# Altium schematic symbol library lib_datalogger.SchLib: 1246 symbols (part 6 of 16) (continued)
## CMP-009-00005-6
designator R?, comment Resistor 0R +/- 5% 0402 100 mW  value 0  Mounting Technology: SM  Voltage Rating: 50V  RoHS Compliant: True  Case/Package: 0402  Pins: 2  Tolerance: 5%  Min Operating Temperature: -55°C  Max Operating Temperature: 155°C  Power: 100mW
Chip Resistor, 0 Ohm, 0.1 W, -55 to 155 degC, 0402 (1005 Metric)
footprint RESC1005X40X25NL05T05 (Chip Resistor, 2-Leads, Body 1.05x0.55mm, IPC Medium Density)
footprint RESC1005X40X25ML05T05 (Chip Resistor, 2-Leads, Body 1.05x0.55mm, IPC Low Density)
footprint RESC1005X40X25LL05T05 (Chip Resistor, 2-Leads, Body 1.05x0.55mm, IPC High Density)
pins: 1, 2

## CMP-009-00006-6
designator R?, comment Resistor 0R +/- 5% 0603 100 mW  value 0  RoHS Compliant: True  Voltage Rating: 50V  Max Operating Temperature: 155°C  Pins: 2  Min Operating Temperature: -55°C  Tolerance: 5%  Power: 100mW  Mounting Technology: SM  Case/Package: 0603
Chip Resistor, 0 Ohm, 0.1 W, -55 to 155 degC, 0603 (1608 Metric)
footprint RESC1608X55X25ML10T15 (Chip Resistor, 2-Leads, Body 1.70x0.90mm, IPC Low Density)
footprint RESC1608X55X25NL10T15 (Chip Resistor, 2-Leads, Body 1.70x0.90mm, IPC Medium Density)
footprint RESC1608X55X25LL10T15 (Chip Resistor, 2-Leads, Body 1.70x0.90mm, IPC High Density)
pins: 1, 2

## CMP-009-00007-6
designator R?, comment Resistor 0R +/- 5% 0805 125 mW  value 0  Max Operating Temperature: 155°C  Case/Package: 0805  Tolerance: 5%  Voltage Rating: 50V  Pins: 2  Min Operating Temperature: -55°C  Mounting Technology: SM  Power: 125mW  RoHS Compliant: True
Chip Resistor, 0 Ohm, 0.125 W, -55 to 155 degC, 0805 (2012 Metric)
footprint RESC2013X60X35LL10T20 (Chip Resistor, 2-Leads, Body 2.1x1.35mm, IPC High Density)
footprint RESC2013X60X35ML10T20 (Chip Resistor, 2-Leads, Body 2.00x1.25mm, IPC Low Density)
footprint RESC2013X60X35NL10T20 (Chip Resistor, 2-Leads, Body 2.1x1.35mm, IPC Medium Density)
pins: 1, 2

## CMP-009-00008-6
designator R?, comment Resistor 0R +/- 0.05% 1206 250 mW  value 0  Min Operating Temperature: -55°C  Tolerance: 0.05%  RoHS Compliant: True  Power: 250mW  Max Operating Temperature: 155°C  Voltage Rating: 200V  Mounting Technology: SM  Case/Package: 1206  Pins: 2
Chip Resistor, 0 Ohm, 0.25 W, -55 to 155 degC, 1206 (3216 Metric)
footprint RESC3116X70X50LL13T20 (Chip Resistor, 2-Leads, Body 3.25x1.65mm, IPC High Density)
footprint RESC3116X70X50ML13T20 (Chip Resistor, 2-Leads, Body 3.25x1.65mm, IPC Low Density)
footprint RESC3116X70X50NL13T20 (Chip Resistor, 2-Leads, Body 3.25x1.65mm, IPC Medium Density)
pins: 1, 2

## CMP-009-00009-6
designator R?, comment Resistor 1k +/-1% 0402 100 mW  value 1k  Tolerance: 1%  Voltage Rating: 50V  Power: 100mW  RoHS Compliant: True  Mounting Technology: SM  Pins: 2  Case/Package: 0402  Min Operating Temperature: -55°C  Max Operating Temperature: 155°C
Chip Resistor, 1 KOhm, +/- 1%, 0.1 W, -55 to 155 degC, 0402 (1005 Metric)
footprint RESC1005X40X25NL05T05 (Chip Resistor, 2-Leads, Body 1.05x0.55mm, IPC Medium Density)
footprint RESC1005X40X25ML05T05 (Chip Resistor, 2-Leads, Body 1.05x0.55mm, IPC Low Density)
footprint RESC1005X40X25LL05T05 (Chip Resistor, 2-Leads, Body 1.05x0.55mm, IPC High Density)
pins: 1, 2

## CMP-009-00010-6
designator R?, comment Resistor 1k +/-1% 0805 125 mW  value 1k  Voltage Rating: 150V  Tolerance: 1%  Max Operating Temperature: 155°C  Case/Package: 0805  Min Operating Temperature: -55°C  Power: 125mW  Mounting Technology: SM  Pins: 2  RoHS Compliant: True
Chip Resistor, 1 KOhm, +/- 1%, 0.125 W, -55 to 155 degC, 0805 (2013 Metric)
footprint RESC2013X70X40LL20T20 (Chip Resistor, 2-Leads, Body 2.2x1.35mm, IPC High Density)
footprint RESC2013X70X40ML20T20 (Chip Resistor, 2-Leads, Body 2.2x1.35mm, IPC Low Density)
footprint RESC2013X70X40NL20T20 (Chip Resistor, 2-Leads, Body 2.2x1.35mm, IPC Medium Density)
pins: 1, 2

## CMP-009-00011-6
designator R?, comment Resistor 1k +/-1% 1206 250 mW  value 1k  Case/Package: 1206  Power: 250mW  Mounting Technology: SM  RoHS Compliant: True  Min Operating Temperature: -55°C  Tolerance: 1%  Pins: 2  Max Operating Temperature: 155°C  Voltage Rating: 200V
Chip Resistor, 1 KOhm, +/- 1%, 0.25 W, -55 to 155 degC, 1206 (3216 Metric)
footprint RESC3116X70X50LL13T20 (Chip Resistor, 2-Leads, Body 3.25x1.65mm, IPC High Density)
footprint RESC3116X70X50ML13T20 (Chip Resistor, 2-Leads, Body 3.25x1.65mm, IPC Low Density)
footprint RESC3116X70X50NL13T20 (Chip Resistor, 2-Leads, Body 3.25x1.65mm, IPC Medium Density)
pins: 1, 2

## CMP-009-00012-5
designator R?, comment Resistor 1k +/-1% 0402 63 mW  value 100k  Power: 63mW  Max Operating Temperature: 155°C  Min Operating Temperature: -55°C  Case/Package: 0402  Pins: 2  RoHS Compliant: True  Tolerance: 1%  Mounting Technology: SM
Chip Resistor, 1 KOhm, +/- 1%, 63 mW, -55 to 155 degC, 0402 (1005 Metric)
footprint RESC0805(2012)_L (Chip Resistor, Body 2.0x1.3mm, IPC High Density)
footprint RESC1005X40X25NL05T05 (Chip Resistor, 2-Leads, Body 1.05x0.55mm, IPC Medium Density)
footprint RESC1005X40X25ML05T05 (Chip Resistor, 2-Leads, Body 1.05x0.55mm, IPC Low Density)
footprint RESC1005X40X25LL05T05 (Chip Resistor, 2-Leads, Body 1.05x0.55mm, IPC High Density)
pins: 1, 2
1 alternate drawing of the same symbol

## CMP-009-00013-5
designator R?, comment Resistor 1k +/-5% 0402 63 mW  value 1k  Tolerance: 5%  Case/Package: 0402  Mounting Technology: SM  Min Operating Temperature: -55°C  Pins: 2  Max Operating Temperature: 155°C  RoHS Compliant: True  Power: 63mW
Chip Resistor, 1 KOhm, +/- 5%, 0.063 W, -55 to 155 degC, 0402 (1005 Metric)
footprint RESC0805(2012)_L (Chip Resistor, Body 2.0x1.3mm, IPC High Density)
footprint RESC1005X40X25NL10T10 (Chip Resistor, 2-Leads, Body 1.1x0.6mm, IPC Medium Density)
footprint RESC1005X40X25LL10T10 (Chip Resistor, 2-Leads, Body 1.1x0.6mm, IPC High Density)
footprint RESC1005X40X25ML10T10 (Chip Resistor, 2-Leads, Body 1.1x0.6mm, IPC Low Density)
pins: 1, 2
1 alternate drawing of the same symbol

## CMP-009-00014-5
designator R?, comment Resistor 1k +/-1% 0603 100 mW  value 1k  Mounting Technology: SM  Voltage Rating: 50V  Pins: 2  Case/Package: 0603  Power: 100mW  Min Operating Temperature: -55°C  Tolerance: 1%  RoHS Compliant: True  Max Operating Temperature: 155°C
Chip Resistor, 1 KOhm, +/-1%, 0.1 W, -55 to 155 degC, 0603 (1608 Metric)
footprint RESC0805(2012)_L (Chip Resistor, Body 2.0x1.3mm, IPC High Density)
footprint RESC1608X55X25ML10T15 (Chip Resistor, 2-Leads, Body 1.70x0.90mm, IPC Low Density)
footprint RESC1608X55X25NL10T15 (Chip Resistor, 2-Leads, Body 1.70x0.90mm, IPC Medium Density)
footprint RESC1608X55X25LL10T15 (Chip Resistor, 2-Leads, Body 1.70x0.90mm, IPC High Density)
pins: 1, 2
1 alternate drawing of the same symbol

## CMP-009-00015-5
designator R?, comment Resistor 10k +/-1% 0402 100 mW  value 10k  Case/Package: 0402  RoHS Compliant: True  Min Operating Temperature: -55°C  Mounting Technology: SM  Tolerance: 1%  Voltage Rating: 50V  Max Operating Temperature: 155°C  Pins: 2  Power: 100mW
Chip Resistor, 10 KOhm, +/- 1%, 0.1 W, -55 to 155 degC, 0402 (1005 Metric)
footprint RESC0805(2012)_L (Chip Resistor, Body 2.0x1.3mm, IPC High Density)
footprint RESC1005X40X25NL05T05 (Chip Resistor, 2-Leads, Body 1.05x0.55mm, IPC Medium Density)
footprint RESC1005X40X25ML05T05 (Chip Resistor, 2-Leads, Body 1.05x0.55mm, IPC Low Density)
footprint RESC1005X40X25LL05T05 (Chip Resistor, 2-Leads, Body 1.05x0.55mm, IPC High Density)
pins: 1, 2
1 alternate drawing of the same symbol

## CMP-009-00016-5
designator R?, comment Resistor 10k +/-1% 1206 250 mW  value 10k  Pins: 2  Max Operating Temperature: 155°C  Tolerance: 1%  Power: 250mW  Voltage Rating: 200V  RoHS Compliant: True  Case/Package: 1206  Min Operating Temperature: -55°C  Mounting Technology: SM
Chip Resistor, 10 KOhm, +/- 1%, 0.25 W, -55 to 155 degC, 1206 (3216 Metric)
footprint RESC0805(2012)_L (Chip Resistor, Body 2.0x1.3mm, IPC High Density)
footprint RESC3216X60X45NL15T20 (Chip Resistor, 2-Leads, Body 3.3x1.75mm, IPC Medium Density)
footprint RESC3216X60X45ML15T20 (Chip Resistor, 2-Leads, Body 3.3x1.75mm, IPC Low Density)
footprint RESC3216X60X45LL15T20 (Chip Resistor, 2-Leads, Body 3.3x1.75mm, IPC High Density)
pins: 1, 2
1 alternate drawing of the same symbol

## CMP-009-00017-5
designator R?, comment Resistor 10k +/-1% 0603 100 mW  value 10k  RoHS Compliant: True  Voltage Rating: 50V  Min Operating Temperature: -55°C  Pins: 2  Case/Package: 0603  Power: 100mW  Mounting Technology: SM  Max Operating Temperature: 155°C  Tolerance: 1%
Chip Resistor, 10 KOhm, +/- 1%, 01 W, -55 to 155 degC, 0603 (1608 Metric)
footprint RESC0805(2012)_L (Chip Resistor, Body 2.0x1.3mm, IPC High Density)
footprint RESC1608X55X25ML10T15 (Chip Resistor, 2-Leads, Body 1.70x0.90mm, IPC Low Density)
footprint RESC1608X55X25NL10T15 (Chip Resistor, 2-Leads, Body 1.70x0.90mm, IPC Medium Density)
footprint RESC1608X55X25LL10T15 (Chip Resistor, 2-Leads, Body 1.70x0.90mm, IPC High Density)
pins: 1, 2
1 alternate drawing of the same symbol

## CMP-009-00018-5
designator R?, comment Resistor 10k +/-1% 0805 125 mW  value 10k  Tolerance: 1%  Pins: 2  Min Operating Temperature: -55°C  Case/Package: 0805  Max Operating Temperature: 155°C  RoHS Compliant: True  Power: 125mW  Voltage Rating: 150V  Mounting Technology: SM
Chip Resistor, 10 KOhm, +/- 1%, 125 mW, -55 to 155 degC, 0805 (2012 Metric)
footprint RESC0805(2012)_L (Chip Resistor, Body 2.0x1.3mm, IPC High Density)
footprint RESC2013X50X35ML15T15 (Chip Resistor, 2-Leads, Body 2.2x1.4mm, IPC Low Density)
footprint RESC2013X50X35LL15T15 (Chip Resistor, 2-Leads, Body 2.2x1.4mm, IPC High Density)
footprint RESC2013X50X35NL15T15 (Chip Resistor, 2-Leads, Body 2.2x1.4mm, IPC Medium Density)
pins: 1, 2
1 alternate drawing of the same symbol

## CMP-009-00019-5
designator R?, comment Resistor 10k +/-1% 0402 63 mW  value 10k  Case/Package: 0402  Power: 63mW  Mounting Technology: SM  Pins: 2  Min Operating Temperature: -55°C  Tolerance: 1%  RoHS Compliant: True  Max Operating Temperature: 155°C  Voltage Rating: 50V
Chip Resistor, 10 KOhm, +/- 1%, 63 mW, -55 to 155 degC, 0402 (1005 Metric)
footprint RESC0805(2012)_L (Chip Resistor, Body 2.0x1.3mm, IPC High Density)
footprint RESC1005X40X25NL05T05 (Chip Resistor, 2-Leads, Body 1.05x0.55mm, IPC Medium Density)
footprint RESC1005X40X25ML05T05 (Chip Resistor, 2-Leads, Body 1.05x0.55mm, IPC Low Density)
footprint RESC1005X40X25LL05T05 (Chip Resistor, 2-Leads, Body 1.05x0.55mm, IPC High Density)
pins: 1, 2
1 alternate drawing of the same symbol

## CMP-009-00020-5
designator R?, comment Resistor 10R +/-5% 0402 63 mW  value 10  Case/Package: 0402  Max Operating Temperature: 155°C  Min Operating Temperature: -55°C  Pins: 2  Power: 63mW  Tolerance: 5%  RoHS Compliant: True  Mounting Technology: SM
Chip Resistor, 10 Ohm, +/- 5%, 0.063 W, -55 to 155 degC, 0402 (1005 Metric)
footprint RESC0805(2012)_L (Chip Resistor, Body 2.0x1.3mm, IPC High Density)
footprint RESC1005X40X25NL10T10 (Chip Resistor, 2-Leads, Body 1.1x0.6mm, IPC Medium Density)
footprint RESC1005X40X25LL10T10 (Chip Resistor, 2-Leads, Body 1.1x0.6mm, IPC High Density)
footprint RESC1005X40X25ML10T10 (Chip Resistor, 2-Leads, Body 1.1x0.6mm, IPC Low Density)
pins: 1, 2
1 alternate drawing of the same symbol

## CMP-009-00021-5
designator R?, comment Resistor 100k +/-1% 0402 63 mW  value 100k  Pins: 2  Tolerance: 1%  Max Operating Temperature: 155°C  Case/Package: 0402  Min Operating Temperature: -55°C  Voltage Rating: 50V  Power: 63mW  Mounting Technology: SM  RoHS Compliant: True
Chip Resistor, 100 KOhm, +/- 1%, 0.063 W, -55 to 155 degC, 0402 (1005 Metric)
footprint RESC0805(2012)_L (Chip Resistor, Body 2.0x1.3mm, IPC High Density)
footprint RESC1005X40X25NL05T05 (Chip Resistor, 2-Leads, Body 1.05x0.55mm, IPC Medium Density)
footprint RESC1005X40X25ML05T05 (Chip Resistor, 2-Leads, Body 1.05x0.55mm, IPC Low Density)
footprint RESC1005X40X25LL05T05 (Chip Resistor, 2-Leads, Body 1.05x0.55mm, IPC High Density)
pins: 1, 2
1 alternate drawing of the same symbol

## CMP-009-00022-5
designator R?, comment Resistor 100k +/-1% 0402 100 mW  value 100k  Mounting Technology: SM  Pins: 2  Power: 100mW  Min Operating Temperature: -55°C  Tolerance: 1%  RoHS Compliant: True  Case/Package: 0402  Voltage Rating: 50V  Max Operating Temperature: 155°C
Chip Resistor, 100 KOhm, +/- 1%, 0.1 W, -55 to 155 degC, 0402 (1005 Metric)
footprint RESC0805(2012)_L (Chip Resistor, Body 2.0x1.3mm, IPC High Density)
footprint RESC1005X40X25NL05T05 (Chip Resistor, 2-Leads, Body 1.05x0.55mm, IPC Medium Density)
footprint RESC1005X40X25ML05T05 (Chip Resistor, 2-Leads, Body 1.05x0.55mm, IPC Low Density)
footprint RESC1005X40X25LL05T05 (Chip Resistor, 2-Leads, Body 1.05x0.55mm, IPC High Density)
pins: 1, 2
1 alternate drawing of the same symbol

## CMP-009-00023-5
designator R?, comment Resistor 100k +/-1% 0603 100 mW  value 100k  Max Operating Temperature: 155°C  RoHS Compliant: True  Voltage Rating: 50V  Tolerance: 1%  Pins: 2  Case/Package: 0603  Mounting Technology: SM  Min Operating Temperature: -55°C  Power: 100mW
Chip Resistor, 100 KOhm, +/- 1%, 0.1 W, -55 to 155 degC, 0603 (1608 Metric)
footprint RESC0805(2012)_L (Chip Resistor, Body 2.0x1.3mm, IPC High Density)
footprint RESC1608X55X25ML10T15 (Chip Resistor, 2-Leads, Body 1.70x0.90mm, IPC Low Density)
footprint RESC1608X55X25NL10T15 (Chip Resistor, 2-Leads, Body 1.70x0.90mm, IPC Medium Density)
footprint RESC1608X55X25LL10T15 (Chip Resistor, 2-Leads, Body 1.70x0.90mm, IPC High Density)
pins: 1, 2
1 alternate drawing of the same symbol

## CMP-009-00024-5
designator R?, comment Resistor 100k +/-1% 0805 125 mW  value 100k  Power: 125mW  Max Operating Temperature: 155°C  Mounting Technology: SM  Voltage Rating: 150V  RoHS Compliant: True  Tolerance: 1%  Case/Package: 0805  Min Operating Temperature: -55°C  Pins: 2
Chip Resistor, 100 KOhm, +/- 1%, 0.125 W, -55 to 155 degC, 0805 (2012 Metric)
footprint RESC0805(2012)_L (Chip Resistor, Body 2.0x1.3mm, IPC High Density)
footprint RESC2013X70X40LL20T20 (Chip Resistor, 2-Leads, Body 2.2x1.35mm, IPC High Density)
footprint RESC2013X70X40ML20T20 (Chip Resistor, 2-Leads, Body 2.2x1.35mm, IPC Low Density)
footprint RESC2013X70X40NL20T20 (Chip Resistor, 2-Leads, Body 2.2x1.35mm, IPC Medium Density)
pins: 1, 2
1 alternate drawing of the same symbol

## CMP-009-00025-5
designator R?, comment Resistor 100k +/-1% 1206 250 mW  value 100k  RoHS Compliant: True  Max Operating Temperature: 155°C  Voltage Rating: 200V  Pins: 2  Tolerance: 1%  Mounting Technology: SM  Case/Package: 1206  Min Operating Temperature: -55°C  Power: 250mW
Chip Resistor, 100 KOhm, +/- 1%, 0.25 W, -55 to 155 degC, 1206 (3216 Metric)
footprint RESC0805(2012)_L (Chip Resistor, Body 2.0x1.3mm, IPC High Density)
footprint RESC3216X60X45NL15T20 (Chip Resistor, 2-Leads, Body 3.3x1.75mm, IPC Medium Density)
footprint RESC3216X60X45ML15T20 (Chip Resistor, 2-Leads, Body 3.3x1.75mm, IPC Low Density)
footprint RESC3216X60X45LL15T20 (Chip Resistor, 2-Leads, Body 3.3x1.75mm, IPC High Density)
pins: 1, 2
1 alternate drawing of the same symbol

## CMP-009-00026-5
designator R?, comment Resistor 15k +/-1% 0402 63 mW  value 15k  Power: 63mW  Min Operating Temperature: -55°C  Tolerance: 1%  Max Operating Temperature: 155°C  Mounting Technology: SM  Case/Package: 0402  RoHS Compliant: True  Pins: 2
Chip Resistor, 15 KOhm, +/- 1%, 0.063 W, -55 to 155 degC, 0402 (1005 Metric)
footprint RESC0805(2012)_L (Chip Resistor, Body 2.0x1.3mm, IPC High Density)
footprint RESC1005X40X25NL10T10 (Chip Resistor, 2-Leads, Body 1.1x0.6mm, IPC Medium Density)
footprint RESC1005X40X25LL10T10 (Chip Resistor, 2-Leads, Body 1.1x0.6mm, IPC High Density)
footprint RESC1005X40X25ML10T10 (Chip Resistor, 2-Leads, Body 1.1x0.6mm, IPC Low Density)
pins: 1, 2
1 alternate drawing of the same symbol

## CMP-009-00027-5
designator R?, comment Resistor 22R +/-1% 0603 100 mW  value 22  Max Operating Temperature: 155°C  Min Operating Temperature: -55°C  Power: 100mW  Tolerance: 1%  Voltage Rating: 75V  RoHS Compliant: True  Mounting Technology: SM  Case/Package: 0603  Pins: 2
Chip Resistor, 22 Ohm, +/- 1%, 100 mW, -55 to 155 degC, 0603 (1608 Metric)
footprint RESC0805(2012)_L (Chip Resistor, Body 2.0x1.3mm, IPC High Density)
footprint RESC1609X50X30ML08T20 (Chip Resistor, 2-Leads, Body 1.65x0.95mm, IPC Low Density)
footprint RESC1609X50X30LL08T20 (Chip Resistor, 2-Leads, Body 1.65x0.95mm, IPC High Density)
footprint RESC1609X50X30NL08T20 (Chip Resistor, 2-Leads, Body 1.65x0.95mm, IPC Medium Density)
pins: 1, 2
1 alternate drawing of the same symbol

## CMP-009-00028-5
designator R?, comment Resistor 33k +/-5% 0402 63 mW  value 33k  Tolerance: 5%  Case/Package: 0402  Power: 63mW  Mounting Technology: SM  Min Operating Temperature: -55°C  Max Operating Temperature: 155°C  Pins: 2  RoHS Compliant: True
Chip Resistor, 33 KOhm, +/- 5%, 0.063 W, -55 to 155 degC, 0402 (1005 Metric)
footprint RESC0805(2012)_L (Chip Resistor, Body 2.0x1.3mm, IPC High Density)
footprint RESC1005X40X25NL10T10 (Chip Resistor, 2-Leads, Body 1.1x0.6mm, IPC Medium Density)
footprint RESC1005X40X25LL10T10 (Chip Resistor, 2-Leads, Body 1.1x0.6mm, IPC High Density)
footprint RESC1005X40X25ML10T10 (Chip Resistor, 2-Leads, Body 1.1x0.6mm, IPC Low Density)
pins: 1, 2
1 alternate drawing of the same symbol

## CMP-009-00029-5
designator R?, comment Resistor 33R +/-1% 0402 63 mW  value 33  Pins: 2  Power: 63mW  Mounting Technology: SM  Min Operating Temperature: -55°C  Tolerance: 1%  Max Operating Temperature: 155°C  RoHS Compliant: True  Case/Package: 0402
Chip Resistor, 33 Ohm, +/- 1%, 0.063 W, -55 to 155 degC, 0402 (1005 Metric)
footprint RESC0805(2012)_L (Chip Resistor, Body 2.0x1.3mm, IPC High Density)
footprint RESC1005X40X25NL10T10 (Chip Resistor, 2-Leads, Body 1.1x0.6mm, IPC Medium Density)
footprint RESC1005X40X25LL10T10 (Chip Resistor, 2-Leads, Body 1.1x0.6mm, IPC High Density)
footprint RESC1005X40X25ML10T10 (Chip Resistor, 2-Leads, Body 1.1x0.6mm, IPC Low Density)
pins: 1, 2
1 alternate drawing of the same symbol

## CMP-009-00030-5
designator R?, comment Resistor 4k7 +/-1% 0402 100 mW  value 4.7k  Mounting Technology: SM  Power: 100mW  RoHS Compliant: True  Voltage Rating: 50V  Tolerance: 1%  Min Operating Temperature: -55°C  Max Operating Temperature: 155°C  Case/Package: 0402  Pins: 2
Chip Resistor, 4.7 KOhm, +/- 1%, 0.1 W, -55 to 155 degC, 0402 (1005 Metric)
footprint RESC0805(2012)_L (Chip Resistor, Body 2.0x1.3mm, IPC High Density)
footprint RESC1005X40X25NL05T05 (Chip Resistor, 2-Leads, Body 1.05x0.55mm, IPC Medium Density)
footprint RESC1005X40X25ML05T05 (Chip Resistor, 2-Leads, Body 1.05x0.55mm, IPC Low Density)
footprint RESC1005X40X25LL05T05 (Chip Resistor, 2-Leads, Body 1.05x0.55mm, IPC High Density)
pins: 1, 2
1 alternate drawing of the same symbol

## CMP-009-00031-5
designator R?, comment Resistor 4k7 +/-1% 0603 100 mW  value 4.7k  Tolerance: 1%  Mounting Technology: SM  Case/Package: 0603  RoHS Compliant: True  Power: 100mW  Pins: 2  Min Operating Temperature: -55°C  Max Operating Temperature: 155°C
Chip Resistor, 4.7 KOhm, +/- 1%, 0.1 W, -55 to 155 degC, 0603 (1608 Metric)
footprint RESC0805(2012)_L (Chip Resistor, Body 2.0x1.3mm, IPC High Density)
footprint RESC1608X55X25ML10T15 (Chip Resistor, 2-Leads, Body 1.70x0.90mm, IPC Low Density)
footprint RESC1608X55X25NL10T15 (Chip Resistor, 2-Leads, Body 1.70x0.90mm, IPC Medium Density)
footprint RESC1608X55X25LL10T15 (Chip Resistor, 2-Leads, Body 1.70x0.90mm, IPC High Density)
pins: 1, 2
1 alternate drawing of the same symbol

## CMP-009-00032-5
designator R?, comment Resistor 4k7 +/-1% 0805 125 mW  value 4.7k  Max Operating Temperature: 155°C  Power: 125mW  Min Operating Temperature: -55°C  Voltage Rating: 150V  Case/Package: 0805  RoHS Compliant: True  Pins: 2  Tolerance: 1%  Mounting Technology: SM
Chip Resistor, 4.7 KOhm, +/- 1%, 0.125 W, -55 to 155 degC, 0805 (2012 Metric)
footprint RESC0805(2012)_L (Chip Resistor, Body 2.0x1.3mm, IPC High Density)
footprint RESC2013X70X40LL20T20 (Chip Resistor, 2-Leads, Body 2.2x1.35mm, IPC High Density)
footprint RESC2013X70X40ML20T20 (Chip Resistor, 2-Leads, Body 2.2x1.35mm, IPC Low Density)
footprint RESC2013X70X40NL20T20 (Chip Resistor, 2-Leads, Body 2.2x1.35mm, IPC Medium Density)
pins: 1, 2
1 alternate drawing of the same symbol

## CMP-009-00033-5
designator R?, comment Resistor 4k7 +/-1% 1206 250 mW  value 4.7k  Pins: 2  Min Operating Temperature: -55°C  Max Operating Temperature: 155°C  Case/Package: 1206  Power: 250mW  Tolerance: 1%  RoHS Compliant: True  Mounting Technology: SM  Voltage Rating: 200V
Chip Resistor, 4.7 KOhm, +/- 1%, 0.25 W, -55 to 155 degC, 1206 (3216 Metric)
footprint RESC0805(2012)_L (Chip Resistor, Body 2.0x1.3mm, IPC High Density)
footprint RESC3116X70X50LL13T20 (Chip Resistor, 2-Leads, Body 3.25x1.65mm, IPC High Density)
footprint RESC3116X70X50ML13T20 (Chip Resistor, 2-Leads, Body 3.25x1.65mm, IPC Low Density)
footprint RESC3116X70X50NL13T20 (Chip Resistor, 2-Leads, Body 3.25x1.65mm, IPC Medium Density)
pins: 1, 2
1 alternate drawing of the same symbol

## CMP-009-00034-5
designator R?, comment Resistor 4k7 +/-1% 0402 63 mW  value 4.7k  Case/Package: 0402  Tolerance: 1%  Max Operating Temperature: 155°C  Pins: 2  RoHS Compliant: True  Min Operating Temperature: -55°C  Power: 63mW  Voltage Rating: 50V  Mounting Technology: SM
Chip Resistor, 4.7 KOhm, +/- 1%, 63 mW, -55 to 155 degC, 0402 (1005 Metric)
footprint RESC0805(2012)_L (Chip Resistor, Body 2.0x1.3mm, IPC High Density)
footprint RESC1005X40X25NL05T05 (Chip Resistor, 2-Leads, Body 1.05x0.55mm, IPC Medium Density)
footprint RESC1005X40X25ML05T05 (Chip Resistor, 2-Leads, Body 1.05x0.55mm, IPC Low Density)
footprint RESC1005X40X25LL05T05 (Chip Resistor, 2-Leads, Body 1.05x0.55mm, IPC High Density)
pins: 1, 2
1 alternate drawing of the same symbol

## CMP-009-00035-4
designator R?, comment 12FR050E  value 50m  Composition: Wirewound  Mounting Technology: TH  Tolerance: 1%  Diameter: 2.4mm  Package Description: 2-Pin Axial Lead, Dia 2.4 mm, Body Length 10.6 mm  Datasheet Version: Jun-15  Packaging: Bulk  Voltage Rating: 100mV  Max Operating Temperature: 275°C  RoHS Compliant: True  Package Quantity: 10  Case/Package: Axial  Power: 2W  Pins: 2  Manufacturer: Ohmite  Min Operating Temperature: -55°C
Axial Resistor, 50 mOhm, +/- 1%, 2 W, -55 to 275 degC, 2-Pin THD, RoHS, Bulk; Manufacturer URL: http://www.ohmite.com/; Datasheet URL: http://www.ohmite.com/cat/res_10.pdf; Package Reference: 12FR050E
footprint RESC0805(2012)_L (Chip Resistor, Body 2.0x1.3mm, IPC High Density)
footprint RESA86-1060X240 (Axial Resistor, 2-Leads, Dia 2.4mm, Body Length 10.6mm)
pins: 1, 2
1 alternate drawing of the same symbol

## CMP-009-00036-4
designator F?, comment 1812L110/33MR  value 200M  Packaging: TapeandReel  Datasheet Version: Feb-16  Package Quantity: 1000  Max Operating Temperature: 85°C  Voltage Rating: 33V  Mounting Technology: SM  Package Description: 2-Pin Surface Mount Device, Body 4.55 x 3.24 mm  Manufacturer: Littelfuse  RoHS Compliant: True  Case/Package: 1812  Max Current Rating: 20A  Min Operating Temperature: -40°C
Poly-Fuse (R) Resettable PTC, 0.8 W, 20 A, -40 to 85 degC, 2-Pin SMD, RoHS, Tape and Reel; Datasheet URL: http://www.littelfuse.com/~/media/electronics/datasheets/resettable_ptcs/littelfuse_ptc_1812l_datasheet.pdf.pdf; Package Reference: 1812L110/33MR; Manufacturer URL: http://www.littelfuse.com/; Current Rating: 20A
footprint LFUS-466_V (SMD, 2-Leads, Body 3.175x1.524mm)
footprint LFUS-1812L11033MR_V (SMD, 2-Leads, Body 4.55x3.24mm)
pins: 1, 2

## CMP-009-00037-2
designator R?, comment 3296W-1-102LF  Manufacturer: Bourns  Datasheet Version: May-16  Min Operating Temperature: -55°C  Max Operating Temperature: 150°C  Composition: Potentiometer  Package Description: 3-Pin Through Hole Device, Body 9.53 x 4.83 mm, Pitch 2.54 mm  Power: 500mW  Package Reference: 3296W-1-3  RoHS Compliant: True  Tolerance: 10%  Voltage Rating: 300V  Packaging: Rail/Tube  Mounting Technology: TH  Package Quantity: 50  Resistance: 1k
Square Trimpot(R) Trimming Potentiometer, 1000 Ohm, -55 to 125 degC, 3-Pin THD, RoHS, Tube; Manufacturer URL: http://www.bourns.com/; Case/Package: 3296W-1-3; Datasheet URL: http://www.bourns.com/docs/Product-Datasheets/3296.pdf
footprint BOUR-3296W-1-3 (THD, 3-Leads, Body 9.53x4.83mm, Pitch 2.54mm)
pins: 1 A, 2 B, 3 TAP

## CMP-009-00038-2
designator VR?, comment 3296W-1-103LF  Tolerance: 10%  Min Operating Temperature: -55°C  Case/Package: 3296W  Max Operating Temperature: 150°C  Voltage Rating: 300V  Mounting Technology: TH  Power: 500mW  Package Quantity: 50  Package Description: 3-Pin Through Hole Device, Body 9.53 x 4.83 mm, Pitch 2.54 mm  Packaging: Rail/Tube  Resistance: 10k  RoHS Compliant: True  Datasheet Version: May-16  Manufacturer: Bourns
Square Trimpot(R) Trimming Potentiometer, 10 KOhm, +/- 10%, 0.5 W, -55 to 125 degC, 3-Pin THD, RoHS, Tube; Package Reference: 3296W; Manufacturer URL: http://www.bourns.com/; Datasheet URL: http://www.bourns.com/docs/Product-Datasheets/3296.pdf
footprint BOUR-3296W (THD, 3-Leads, Body 9.53x4.83mm, Pitch 2.54mm)
pins: 1 CCW, 2 S, 3 CW

## CMP-009-00039-2
designator VR?, comment 3362P-1-103LF  Packaging: Rail/Tube  Package Reference: 3326P  Manufacturer: Bourns  Composition: Potentiometer  Tolerance: 10%  Package Description: 3-Pin Through Hole Device, Body 6.6 x 6.99 mm, Pitch 2.54 mm  Power: 500mW  Voltage Rating: 300V  Max Operating Temperature: 125°C  Min Operating Temperature: -55°C  Datasheet Version: May-16  Lead Pitch: 2.54mm  Pins: 3  Resistance: 10k  Package Quantity: 250  RoHS Compliant: True  Mounting Technology: TH
Square Trimpot(R) Trimming Potentiometer, 10 KOhm, 300 V, -55 to 125 degC, 3-Pin THD, RoHS, Tube; Manufacturer URL: http://www.bourns.com/; Datasheet URL: http://www.bourns.com/docs/Product-Datasheets/3362.pdf; Case/Package: 3326P
footprint BOUR-3362P (THD, 3-Leads, Body 6.6x6.99mm, Pitch 2.54mm)
pins: 1 CCW, 2 S, 3 CW

## CMP-009-00040-2
designator VR?, comment 3362P-1-104LF  RoHS Compliant: True  Voltage Rating: 300V  Manufacturer: Bourns  Resistance: 100k  Mounting Technology: TH  Power: 500mW  Min Operating Temperature: -55°C  Tolerance: 10%  Composition: Potentiometer  Package Quantity: 250  Lead Pitch: 2.54mm  Case/Package: 3326P  Package Description: 3-Pin Through Hole Device, Body 6.6 x 6.99 mm, Pitch 2.54 mm  Datasheet Version: May-16  Packaging: Rail/Tube  Max Operating Temperature: 125°C
Square Trimpot(R) Trimming Potentiometer, 100 KOhm, 300 V, -55 to 125 degC, 3-Pin THD, RoHS, Tube; Datasheet URL: http://www.bourns.com/docs/Product-Datasheets/3362.pdf; Package Reference: 3326P; Manufacturer URL: http://www.bourns.com/
footprint BOUR-3362P (THD, 3-Leads, Body 6.6x6.99mm, Pitch 2.54mm)
pins: 1 CCW, 2 S, 3 CW

## CMP-009-00041-2
designator R?, comment 35WR10KLFTR  Manufacturer: BI Technologies  Mounting Technology: SM  RoHS Compliant: True  Resistance: 10k  Package Quantity: 2000  Package Description: 3-Pin Surface Mount Device, Body 3 x 3.1 mm  Max Operating Temperature: 125°C  Composition: Potentiometer  Power: 100mW  Packaging: TapeandReel  Datasheet Version: Feb-10  Min Operating Temperature: -40°C  Voltage Rating: 50V  Tolerance: 25%
3 mm Single-Turn Open Frame Surface Mount Cermet Trimming Potentiometer, +/- 25%, 35 W, -40 to 125 degC, 3-Pin SMD, RoHS, Tape and Reel; Manufacturer URL: http://www.bi-technologies.net/; Datasheet URL: http://www.bitechnologies.com/pdfs/35.pdf; Package Reference: 35WR10KLFTR; Case/Package: 35WR10KLFTR
footprint BI-35WR10KLFTR-3_V (SMD, 3-Leads, Body 3x3.1mm)
pins: 1, 2, 3

## CMP-009-00042-4
designator RN?, comment CAY16-102J4LF  value 1k  Package Quantity: 5000  Mounting Technology: SM  Elements: 4  Voltage Rating: 50V  Max Operating Temperature: 125°C  Datasheet Version: Sep-14  Package Reference: CAY16-J4  Manufacturer: Bourns  RoHS Compliant: True  Packaging: TapeandReel  Package Description: 8-Pin Surface Mount Device, Body 1.6 x 3.2 mm, Pitch 0.8 mm  Min Operating Temperature: -55°C  Case/Package: 1205  Pins: 8  Tolerance: 5%  Power: 250mW
Chip Resistor Array, 1 KOhm, +/- 5%, 62.5 mW, -55 to 125 degC, 8-Pin SMD, RoHS, Tape and Reel; Manufacturer URL: http://www.bourns.com/; Datasheet URL: http://www.bourns.com/pdfs/CATCAY.pdf
footprint Panasonic_EXB28 (Resistor network, 0402x4, convex terminal)
footprint BOUR-CAY16-J4_V (SMD, 8-Leads, Body 1.6x3.2mm, Pitch 0.8mm)
pins: 1, 2 1, 3 1, 4 1, 5 2, 6 2, 7 2, 8 2

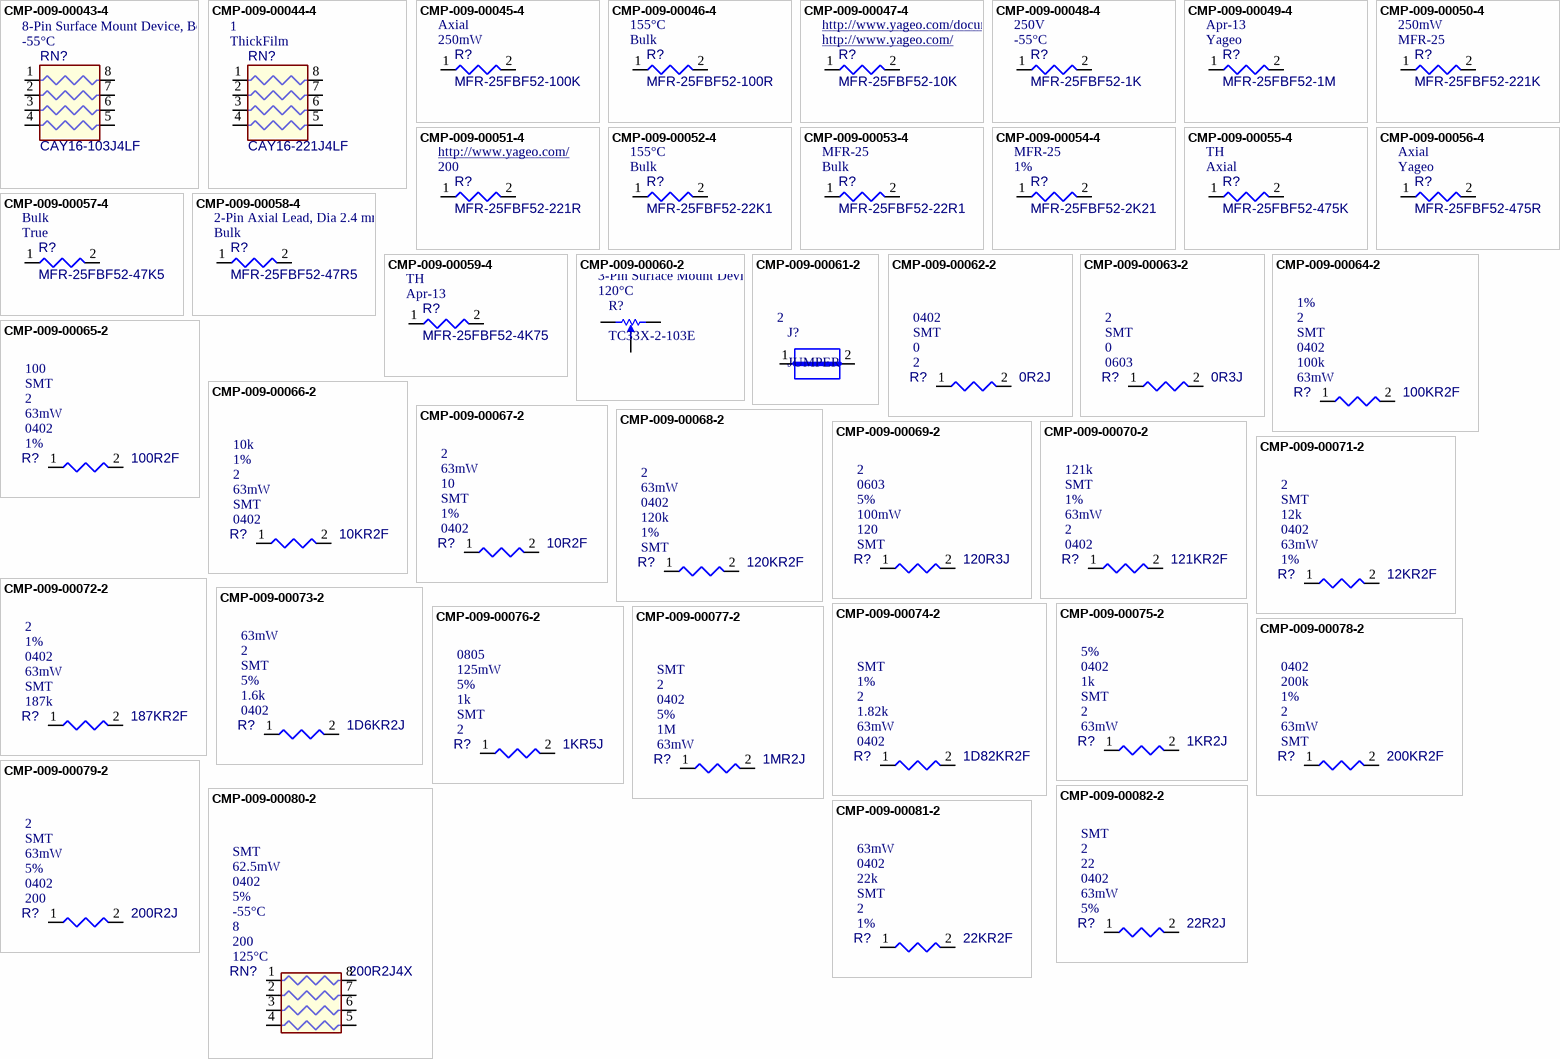
[diagram p18: symbols CMP-009-00043-4 to CMP-009-00082-2]

## CMP-009-00043-4
designator RN?, comment CAY16-103J4LF  value 10k  Min Operating Temperature: -55°C  Package Description: 8-Pin Surface Mount Device, Body 1.6 x 3.2 mm, Pitch 0.8 mm  Pins: 8  Manufacturer: Bourns  Max Operating Temperature: 125°C  Packaging: CutTape  RoHS Compliant: True  Tolerance: 5%  Case/Package: 1205  Elements: 4  Power: 248mW  Package Reference: CAY16-J4  Voltage Rating: 50V  Mounting Technology: SM  Datasheet Version: Jan-15  Package Quantity: 1
Chip Resistor Array, 10 KOhm, +/- 5%, 62.5 mW, -55 to 125 degC, 8-Pin SMD, RoHS, Tape and Reel; Datasheet URL: http://www.bourns.com/docs/Product-Datasheets/CATCAY.pdf; Manufacturer URL: http://www.bourns.com/
footprint Panasonic_EXB28 (Resistor network, 0402x4, convex terminal)
footprint BOUR-CAY16-J4_V (SMD, 8-Leads, Body 1.6x3.2mm, Pitch 0.8mm)
pins: 1, 2 1, 3 1, 4 1, 5 2, 6 2, 7 2, 8 2

## CMP-009-00044-4
designator RN?, comment CAY16-221J4LF  value 220  Composition: ThickFilm  Package Quantity: 1  Case/Package: 1205  Max Operating Temperature: 125°C  Power: 250mW  Min Operating Temperature: -55°C  Pins: 8  Package Reference: CAY16-J4  RoHS Compliant: True  Elements: 4  Manufacturer: Bourns  Mounting Technology: SM  Datasheet Version: Sep-14  Package Description: 8-Pin Surface Mount Device, Body 1.6 x 3.2 mm, Pitch 0.8 mm  Tolerance: 5%  Voltage Rating: 50V  Packaging: TapeandReel
Chip Resistor Array, 220 Ohm, +/- 5%, 62.5 mW, -55 to 125 degC, 8-Pin SMD, RoHS, Tape and Reel; Manufacturer URL: http://www.bourns.com/; Datasheet URL: http://www.bourns.com/pdfs/CATCAY.pdf
footprint Panasonic_EXB28 (Resistor network, 0402x4, convex terminal)
footprint BOUR-CAY16-J4_V (SMD, 8-Leads, Body 1.6x3.2mm, Pitch 0.8mm)
pins: 1, 2 1, 3 1, 4 1, 5 2, 6 2, 7 2, 8 2

## CMP-009-00045-4
designator R?, comment MFR-25FBF52-100K  value 100k  Power: 250mW  Case/Package: Axial  Max Operating Temperature: 155°C  Package Reference: MFR-25  Package Quantity: 200  Manufacturer: Yageo  Package Description: 2-Pin Axial Lead, Dia 2.4 mm, Body Length 6.3 mm  Tolerance: 1%  Voltage Rating: 250V  Packaging: Bulk  Mounting Technology: TH  Min Operating Temperature: -55°C  RoHS Compliant: True  Datasheet Version: Apr-13
Axial Resistor, 100 KOhm, +/- 1%, 0.25 W, -55 to 155 degC, 2-Pin THD, RoHS, Bulk; Manufacturer URL: http://www.yageo.com/; Datasheet URL: http://www.yageo.com/documents/recent/Yageo%20LR_MFR_2013.pdf
footprint RESC0805(2012)_L (Chip Resistor, Body 2.0x1.3mm, IPC High Density)
footprint RESA60-630X240 (Axial Resistor, 2-Leads, Dia 2.4mm, Body Length 6.3mm)
pins: 1, 2
1 alternate drawing of the same symbol